# Altium schematic symbol library jlcpcb_2025_04_inductors_extended_0402.schlib: 1396 symbols (part 4 of 8) (continued)
## LQW15AN16NJ00D (continued)

## LQW15AN18NG00D
designator L?  Inductance: 18nH
Inductor, 18nH, ±2%, 270mΩ, 370mA, SMD 0402; Manufacturer: Murata Electronics; Manufacturer Part Number: LQW15AN18NG00D; Self-Resonant Frequency: 4.5GHz; Q Factor: 25@250MHz; Package Size: 0402; JLCPCB Basic Part: No; JLCPCB Part Number: C91622; Supplier 1: LCSC; Category: Inductors; Supplier Part Number 1: C91622; Tolerance: ±2%; Rated Current: 370mA; DC Resistance: 270mΩ; RoHS: Yes; ComponentLink1Description: Datasheet; ComponentLink1URL: https://wmsc.lcsc.com/wmsc/upload/file/pdf/v2/lcsc/1811081522_Murata-Electronics-LQW15AN18NG00D_C91622.pdf; ComponentLink2Description: JLCPCB Part URL; ComponentLink2URL: https://jlcpcb.com/partdetail/C91622; ComponentLink3Description: LCSC Part URL; ComponentLink3URL: https://lcsc.com/product-detail/Inductors-SMD_Murata-Electronics-Murata-Electronics-LQW15AN18NG00D_C91622.html
footprint IND-0402 (0402 (1005M) Inductor)
pins: 1, 2

## LQW15AN18NG80D
designator L?  Inductance: 18nH
Inductor, 18nH, ±2%, 130mΩ, 1.05A, SMD 0402; Manufacturer: Murata Electronics; Manufacturer Part Number: LQW15AN18NG80D; Package Size: 0402; JLCPCB Basic Part: No; JLCPCB Part Number: C908004; Supplier 1: LCSC; Category: Inductors; Supplier Part Number 1: C908004; Tolerance: ±2%; Rated Current: 1.05A; DC Resistance: 130mΩ; RoHS: Yes; ComponentLink1Description: Datasheet; ComponentLink1URL: https://wmsc.lcsc.com/wmsc/upload/file/pdf/v2/lcsc/2304140030_Murata-Electronics-LQW15AN18NG80D_C908004.pdf; ComponentLink2Description: JLCPCB Part URL; ComponentLink2URL: https://jlcpcb.com/partdetail/C908004; ComponentLink3Description: LCSC Part URL; ComponentLink3URL: https://lcsc.com/product-detail/Power-Inductors_Murata-Electronics-Murata-Electronics-LQW15AN18NG80D_C908004.html
footprint IND-0402 (0402 (1005M) Inductor)
pins: 1, 2

## LQW15AN18NH00D
designator L?  Inductance: 18nH
Inductor, 18nH, ±3%, 270mΩ, 370mA, SMD 0402; Manufacturer: Murata Electronics; Manufacturer Part Number: LQW15AN18NH00D; Self-Resonant Frequency: 4.5GHz; Q Factor: 25@250MHz; Package Size: 0402; JLCPCB Basic Part: No; JLCPCB Part Number: C237611; Supplier 1: LCSC; Category: Inductors; Supplier Part Number 1: C237611; Tolerance: ±3%; Rated Current: 370mA; DC Resistance: 270mΩ; RoHS: Yes; ComponentLink1Description: Datasheet; ComponentLink1URL: https://wmsc.lcsc.com/wmsc/upload/file/pdf/v2/lcsc/2304140030_Murata-Electronics-LQW15AN18NH00D_C237611.pdf; ComponentLink2Description: JLCPCB Part URL; ComponentLink2URL: https://jlcpcb.com/partdetail/C237611; ComponentLink3Description: LCSC Part URL; ComponentLink3URL: https://lcsc.com/product-detail/Inductors-SMD_Murata-Electronics-Murata-Electronics-LQW15AN18NH00D_C237611.html
footprint IND-0402 (0402 (1005M) Inductor)
pins: 1, 2

## LQW15AN18NJ00D
designator L?  Inductance: 18nH
Inductor, 18nH, ±5%, 270mΩ, SMD 0402; Manufacturer: Murata Electronics; Manufacturer Part Number: LQW15AN18NJ00D; Self-Resonant Frequency: 4.5GHz; Q Factor: 25@250MHz; Package Size: 0402; JLCPCB Basic Part: No; JLCPCB Part Number: C82917; Supplier 1: LCSC; Category: Inductors; Supplier Part Number 1: C82917; Tolerance: ±5%; DC Resistance: 270mΩ; RoHS: Yes; ComponentLink1Description: Datasheet; ComponentLink1URL: https://wmsc.lcsc.com/wmsc/upload/file/pdf/v2/lcsc/1811081614_Murata-Electronics-LQW15AN18NJ00D_C82917.pdf; ComponentLink2Description: JLCPCB Part URL; ComponentLink2URL: https://jlcpcb.com/partdetail/C82917; ComponentLink3Description: LCSC Part URL; ComponentLink3URL: https://lcsc.com/product-detail/Inductors-SMD_Murata-Electronics-Murata-Electronics-LQW15AN18NJ00D_C82917.html
footprint IND-0402 (0402 (1005M) Inductor)
pins: 1, 2

## LQW15AN18NJ80D
designator L?  Inductance: 18nH
Inductor, 18nH, ±5%, 130mΩ, SMD 0402; Manufacturer: Murata Electronics; Manufacturer Part Number: LQW15AN18NJ80D; Self-Resonant Frequency: 5.2GHz; Q Factor: 30@250MHz; Package Size: 0402; JLCPCB Basic Part: No; JLCPCB Part Number: C344018; Supplier 1: LCSC; Category: Inductors; Supplier Part Number 1: C344018; Tolerance: ±5%; DC Resistance: 130mΩ; RoHS: Yes; ComponentLink1Description: Datasheet; ComponentLink1URL: https://wmsc.lcsc.com/wmsc/upload/file/pdf/v2/lcsc/2304140030_Murata-Electronics-LQW15AN18NJ80D_C344018.pdf; ComponentLink2Description: JLCPCB Part URL; ComponentLink2URL: https://jlcpcb.com/partdetail/C344018; ComponentLink3Description: LCSC Part URL; ComponentLink3URL: https://lcsc.com/product-detail/Inductors-SMD_Murata-Electronics-Murata-Electronics-LQW15AN18NJ80D_C344018.html
footprint IND-0402 (0402 (1005M) Inductor)
pins: 1, 2

## LQW15AN19NG00D
designator L?  Inductance: 19nH
Inductor, 19nH, ±2%, 270mΩ, 370mA, SMD 0402; Manufacturer: Murata Electronics; Manufacturer Part Number: LQW15AN19NG00D; Self-Resonant Frequency: 4.5GHz; Q Factor: 25@250MHz; Package Size: 0402; JLCPCB Basic Part: No; JLCPCB Part Number: C115489; Supplier 1: LCSC; Category: Inductors; Supplier Part Number 1: C115489; Tolerance: ±2%; Rated Current: 370mA; DC Resistance: 270mΩ; RoHS: Yes; ComponentLink1Description: Datasheet; ComponentLink1URL: https://wmsc.lcsc.com/wmsc/upload/file/pdf/v2/lcsc/2304140030_Murata-Electronics-LQW15AN19NG00D_C115489.pdf; ComponentLink2Description: JLCPCB Part URL; ComponentLink2URL: https://jlcpcb.com/partdetail/C115489; ComponentLink3Description: LCSC Part URL; ComponentLink3URL: https://lcsc.com/product-detail/Inductors-SMD_Murata-Electronics-Murata-Electronics-LQW15AN19NG00D_C115489.html
footprint IND-0402 (0402 (1005M) Inductor)
pins: 1, 2

## LQW15AN19NJ00D
designator L?  Inductance: 19nH
Inductor, 19nH, ±5%, 270mΩ, 370mA, SMD 0402; Manufacturer: Murata Electronics; Manufacturer Part Number: LQW15AN19NJ00D; Package Size: 0402; JLCPCB Basic Part: No; JLCPCB Part Number: C341685; Supplier 1: LCSC; Category: Inductors; Supplier Part Number 1: C341685; Tolerance: ±5%; Rated Current: 370mA; DC Resistance: 270mΩ; RoHS: Yes; ComponentLink1Description: Datasheet; ComponentLink1URL: https://wmsc.lcsc.com/wmsc/upload/file/pdf/v2/lcsc/2308111554_Murata-Electronics-LQW15AN19NJ00D_C341685.pdf; ComponentLink2Description: JLCPCB Part URL; ComponentLink2URL: https://jlcpcb.com/partdetail/C341685; ComponentLink3Description: LCSC Part URL; ComponentLink3URL: https://lcsc.com/product-detail/Power-Inductors_Murata-Electronics-Murata-Electronics-LQW15AN19NJ00D_C341685.html
footprint IND-0402 (0402 (1005M) Inductor)
pins: 1, 2

## LQW15AN20NG00D
designator L?  Inductance: 20nH
Inductor, 20nH, ±2%, 270mΩ, 370mA, SMD 0402; Manufacturer: Murata Electronics; Manufacturer Part Number: LQW15AN20NG00D; Self-Resonant Frequency: 4GHz; Q Factor: 25@250MHz; Package Size: 0402; JLCPCB Basic Part: No; JLCPCB Part Number: C167469; Supplier 1: LCSC; Category: Inductors; Supplier Part Number 1: C167469; Tolerance: ±2%; Rated Current: 370mA; DC Resistance: 270mΩ; RoHS: Yes; ComponentLink1Description: Datasheet; ComponentLink1URL: https://wmsc.lcsc.com/wmsc/upload/file/pdf/v2/lcsc/2304140030_Murata-Electronics-LQW15AN20NG00D_C167469.pdf; ComponentLink2Description: JLCPCB Part URL; ComponentLink2URL: https://jlcpcb.com/partdetail/C167469; ComponentLink3Description: LCSC Part URL; ComponentLink3URL: https://lcsc.com/product-detail/Inductors-SMD_Murata-Electronics-Murata-Electronics-LQW15AN20NG00D_C167469.html
footprint IND-0402 (0402 (1005M) Inductor)
pins: 1, 2

## LQW15AN20NJ00D
designator L?  Inductance: 20nH
Inductor, 20nH, ±5%, 270mΩ, 370mA, SMD 0402; Manufacturer: Murata Electronics; Manufacturer Part Number: LQW15AN20NJ00D; Package Size: 0402; JLCPCB Basic Part: No; JLCPCB Part Number: C668461; Supplier 1: LCSC; Category: Inductors; Supplier Part Number 1: C668461; Tolerance: ±5%; Rated Current: 370mA; DC Resistance: 270mΩ; RoHS: Yes; ComponentLink1Description: Datasheet; ComponentLink1URL: https://wmsc.lcsc.com/wmsc/upload/file/pdf/v2/lcsc/2304140030_Murata-Electronics-LQW15AN20NJ00D_C668461.pdf; ComponentLink2Description: JLCPCB Part URL; ComponentLink2URL: https://jlcpcb.com/partdetail/C668461; ComponentLink3Description: LCSC Part URL; ComponentLink3URL: https://lcsc.com/product-detail/Power-Inductors_Murata-Electronics-Murata-Electronics-LQW15AN20NJ00D_C668461.html
footprint IND-0402 (0402 (1005M) Inductor)
pins: 1, 2

## LQW15AN22NG00D
designator L?  Inductance: 22nH
Inductor, 22nH, ±2%, 300mΩ, 310mA, SMD 0402; Manufacturer: Murata Electronics; Manufacturer Part Number: LQW15AN22NG00D; Self-Resonant Frequency: 4GHz; Q Factor: 25@250MHz; Package Size: 0402; JLCPCB Basic Part: No; JLCPCB Part Number: C86129; Supplier 1: LCSC; Category: Inductors; Supplier Part Number 1: C86129; Tolerance: ±2%; Rated Current: 310mA; DC Resistance: 300mΩ; RoHS: Yes; ComponentLink1Description: Datasheet; ComponentLink1URL: https://wmsc.lcsc.com/wmsc/upload/file/pdf/v2/lcsc/1811081610_Murata-Electronics-LQW15AN22NG00D_C86129.pdf; ComponentLink2Description: JLCPCB Part URL; ComponentLink2URL: https://jlcpcb.com/partdetail/C86129; ComponentLink3Description: LCSC Part URL; ComponentLink3URL: https://lcsc.com/product-detail/Inductors-SMD_Murata-Electronics-Murata-Electronics-LQW15AN22NG00D_C86129.html
footprint IND-0402 (0402 (1005M) Inductor)
pins: 1, 2

## LQW15AN22NG80D
designator L?  Inductance: 22nH
Inductor, 22nH, ±2%, 202mΩ, 780mA, SMD 0402; Manufacturer: Murata Electronics; Manufacturer Part Number: LQW15AN22NG80D; Package Size: 0402; JLCPCB Basic Part: No; JLCPCB Part Number: C524641; Supplier 1: LCSC; Category: Inductors; Supplier Part Number 1: C524641; Tolerance: ±2%; Rated Current: 780mA; DC Resistance: 202mΩ; RoHS: Yes; ComponentLink1Description: Datasheet; ComponentLink1URL: https://wmsc.lcsc.com/wmsc/upload/file/pdf/v2/lcsc/2304140030_Murata-Electronics-LQW15AN22NG80D_C524641.pdf; ComponentLink2Description: JLCPCB Part URL; ComponentLink2URL: https://jlcpcb.com/partdetail/C524641; ComponentLink3Description: LCSC Part URL; ComponentLink3URL: https://lcsc.com/product-detail/Power-Inductors_Murata-Electronics-Murata-Electronics-LQW15AN22NG80D_C524641.html
footprint IND-0402 (0402 (1005M) Inductor)
pins: 1, 2

## LQW15AN22NH00D
designator L?  Inductance: 22nH
Inductor, 22nH, ±3%, 300mΩ, 310mA, SMD 0402; Manufacturer: Murata Electronics; Manufacturer Part Number: LQW15AN22NH00D; Self-Resonant Frequency: 4GHz; Q Factor: 25@250MHz; Package Size: 0402; JLCPCB Basic Part: No; JLCPCB Part Number: C703122; Supplier 1: LCSC; Category: Inductors; Supplier Part Number 1: C703122; Tolerance: ±3%; Rated Current: 310mA; DC Resistance: 300mΩ; RoHS: Yes; ComponentLink1Description: Datasheet; ComponentLink1URL: https://wmsc.lcsc.com/wmsc/upload/file/pdf/v2/lcsc/2304140030_Murata-Electronics-LQW15AN22NH00D_C703122.pdf; ComponentLink2Description: JLCPCB Part URL; ComponentLink2URL: https://jlcpcb.com/partdetail/C703122; ComponentLink3Description: LCSC Part URL; ComponentLink3URL: https://lcsc.com/product-detail/Inductors-SMD_Murata-Electronics-Murata-Electronics-LQW15AN22NH00D_C703122.html
footprint IND-0402 (0402 (1005M) Inductor)
pins: 1, 2

## LQW15AN22NJ00D
designator L?  Inductance: 22nH
Inductor, 22nH, ±5%, 300mΩ, 310mA, SMD 0402; Manufacturer: Murata Electronics; Manufacturer Part Number: LQW15AN22NJ00D; Self-Resonant Frequency: 4GHz; Q Factor: 25@250MHz; Package Size: 0402; JLCPCB Basic Part: No; JLCPCB Part Number: C167470; Supplier 1: LCSC; Category: Inductors; Supplier Part Number 1: C167470; Tolerance: ±5%; Rated Current: 310mA; DC Resistance: 300mΩ; RoHS: Yes; ComponentLink1Description: Datasheet; ComponentLink1URL: https://wmsc.lcsc.com/wmsc/upload/file/pdf/v2/lcsc/2304140030_Murata-Electronics-LQW15AN22NJ00D_C167470.pdf; ComponentLink2Description: JLCPCB Part URL; ComponentLink2URL: https://jlcpcb.com/partdetail/C167470; ComponentLink3Description: LCSC Part URL; ComponentLink3URL: https://lcsc.com/product-detail/Inductors-SMD_Murata-Electronics-Murata-Electronics-LQW15AN22NJ00D_C167470.html
footprint IND-0402 (0402 (1005M) Inductor)
pins: 1, 2

## LQW15AN22NJ80D
designator L?  Inductance: 22nH
Inductor, 22nH, ±5%, 202mΩ, 780mA, SMD 0402; Manufacturer: Murata Electronics; Manufacturer Part Number: LQW15AN22NJ80D; Package Size: 0402; JLCPCB Basic Part: No; JLCPCB Part Number: C2044048; Supplier 1: LCSC; Category: Inductors; Supplier Part Number 1: C2044048; Tolerance: ±5%; Rated Current: 780mA; DC Resistance: 202mΩ; RoHS: Yes; ComponentLink1Description: Datasheet; ComponentLink1URL: https://wmsc.lcsc.com/wmsc/upload/file/pdf/v2/lcsc/2304140030_Murata-Electronics-LQW15AN22NJ80D_C2044048.pdf; ComponentLink2Description: JLCPCB Part URL; ComponentLink2URL: https://jlcpcb.com/partdetail/C2044048; ComponentLink3Description: LCSC Part URL; ComponentLink3URL: https://lcsc.com/product-detail/Power-Inductors_Murata-Electronics-Murata-Electronics-LQW15AN22NJ80D_C2044048.html
footprint IND-0402 (0402 (1005M) Inductor)
pins: 1, 2

## LQW15AN23NG00D
designator L?  Inductance: 23nH
Inductor, 23nH, ±2%, 300mΩ, SMD 0402; Manufacturer: Murata Electronics; Manufacturer Part Number: LQW15AN23NG00D; Self-Resonant Frequency: 3.8GHz; Q Factor: 25@250MHz; Package Size: 0402; JLCPCB Basic Part: No; JLCPCB Part Number: C167471; Supplier 1: LCSC; Category: Inductors; Supplier Part Number 1: C167471; Tolerance: ±2%; DC Resistance: 300mΩ; RoHS: Yes; ComponentLink1Description: Datasheet; ComponentLink1URL: https://wmsc.lcsc.com/wmsc/upload/file/pdf/v2/lcsc/2304140030_Murata-Electronics-LQW15AN23NG00D_C167471.pdf; ComponentLink2Description: JLCPCB Part URL; ComponentLink2URL: https://jlcpcb.com/partdetail/C167471; ComponentLink3Description: LCSC Part URL; ComponentLink3URL: https://lcsc.com/product-detail/Inductors-SMD_Murata-Electronics-Murata-Electronics-LQW15AN23NG00D_C167471.html
footprint IND-0402 (0402 (1005M) Inductor)
pins: 1, 2

## LQW15AN24NG00D
designator L?  Inductance: 24nH
Inductor, 24nH, ±2%, 520mΩ, 280mA, SMD 0402; Manufacturer: Murata Electronics; Manufacturer Part Number: LQW15AN24NG00D; Self-Resonant Frequency: 3.5GHz; Q Factor: 25@250MHz; Package Size: 0402; JLCPCB Basic Part: No; JLCPCB Part Number: C167472; Supplier 1: LCSC; Category: Inductors; Supplier Part Number 1: C167472; Tolerance: ±2%; Rated Current: 280mA; DC Resistance: 520mΩ; RoHS: Yes; ComponentLink1Description: Datasheet; ComponentLink1URL: https://wmsc.lcsc.com/wmsc/upload/file/pdf/v2/lcsc/2304140030_Murata-Electronics-LQW15AN24NG00D_C167472.pdf; ComponentLink2Description: JLCPCB Part URL; ComponentLink2URL: https://jlcpcb.com/partdetail/C167472; ComponentLink3Description: LCSC Part URL; ComponentLink3URL: https://lcsc.com/product-detail/Inductors-SMD_Murata-Electronics-Murata-Electronics-LQW15AN24NG00D_C167472.html
footprint IND-0402 (0402 (1005M) Inductor)
pins: 1, 2

## LQW15AN24NG80D
designator L?  Inductance: 24nH
Inductor, 24nH, ±2%, 212mΩ, 770mA, SMD 0402; Manufacturer: Murata Electronics; Manufacturer Part Number: LQW15AN24NG80D; Package Size: 0402; JLCPCB Basic Part: No; JLCPCB Part Number: C668462; Supplier 1: LCSC; Category: Inductors; Supplier Part Number 1: C668462; Tolerance: ±2%; Rated Current: 770mA; DC Resistance: 212mΩ; RoHS: Yes; ComponentLink1Description: Datasheet; ComponentLink1URL: https://wmsc.lcsc.com/wmsc/upload/file/pdf/v2/lcsc/2105241313_Murata-Electronics-LQW15AN24NG80D_C668462.pdf; ComponentLink2Description: JLCPCB Part URL; ComponentLink2URL: https://jlcpcb.com/partdetail/C668462; ComponentLink3Description: LCSC Part URL; ComponentLink3URL: https://lcsc.com/product-detail/Power-Inductors_Murata-Electronics-Murata-Electronics-LQW15AN24NG80D_C668462.html
footprint IND-0402 (0402 (1005M) Inductor)
pins: 1, 2

## LQW15AN24NJ00D
designator L?  Inductance: 24nH
Inductor, 24nH, ±5%, 520mΩ, 280mA, SMD 0402; Manufacturer: Murata Electronics; Manufacturer Part Number: LQW15AN24NJ00D; Self-Resonant Frequency: 3.5GHz; Q Factor: 25@250MHz; Package Size: 0402; JLCPCB Basic Part: No; JLCPCB Part Number: C341784; Supplier 1: LCSC; Category: Inductors; Supplier Part Number 1: C341784; Tolerance: ±5%; Rated Current: 280mA; DC Resistance: 520mΩ; RoHS: Yes; ComponentLink1Description: Datasheet; ComponentLink1URL: https://wmsc.lcsc.com/wmsc/upload/file/pdf/v2/lcsc/2304140030_Murata-Electronics-LQW15AN24NJ00D_C341784.pdf; ComponentLink2Description: JLCPCB Part URL; ComponentLink2URL: https://jlcpcb.com/partdetail/C341784; ComponentLink3Description: LCSC Part URL; ComponentLink3URL: https://lcsc.com/product-detail/Inductors-SMD_Murata-Electronics-Murata-Electronics-LQW15AN24NJ00D_C341784.html
footprint IND-0402 (0402 (1005M) Inductor)
pins: 1, 2

## LQW15AN27NG00D
designator L?  Inductance: 27nH
Inductor, 27nH, ±2%, 520mΩ, 280mA, SMD 0402; Manufacturer: Murata Electronics; Manufacturer Part Number: LQW15AN27NG00D; Self-Resonant Frequency: 3.5GHz; Q Factor: 25@250MHz; Package Size: 0402; JLCPCB Basic Part: No; JLCPCB Part Number: C98057; Supplier 1: LCSC; Category: Inductors; Supplier Part Number 1: C98057; Tolerance: ±2%; Rated Current: 280mA; DC Resistance: 520mΩ; RoHS: Yes; ComponentLink1Description: Datasheet; ComponentLink1URL: https://wmsc.lcsc.com/wmsc/upload/file/pdf/v2/lcsc/2304140030_Murata-Electronics-LQW15AN27NG00D_C98057.pdf; ComponentLink2Description: JLCPCB Part URL; ComponentLink2URL: https://jlcpcb.com/partdetail/C98057; ComponentLink3Description: LCSC Part URL; ComponentLink3URL: https://lcsc.com/product-detail/Inductors-SMD_Murata-Electronics-Murata-Electronics-LQW15AN27NG00D_C98057.html
footprint IND-0402 (0402 (1005M) Inductor)
pins: 1, 2

## LQW15AN27NG8ZD
designator L?  Inductance: 27nH
Inductor, 27nH, ±2%, 288mΩ, 680mA, SMD 0402; Manufacturer: Murata Electronics; Manufacturer Part Number: LQW15AN27NG8ZD; Package Size: 0402; JLCPCB Basic Part: No; JLCPCB Part Number: C2041663; Supplier 1: LCSC; Category: Inductors; Supplier Part Number 1: C2041663; Tolerance: ±2%; Rated Current: 680mA; DC Resistance: 288mΩ; RoHS: Yes; ComponentLink1Description: Datasheet; ComponentLink1URL: https://wmsc.lcsc.com/wmsc/upload/file/pdf/v2/lcsc/2304140030_Murata-Electronics-LQW15AN27NG8ZD_C2041663.pdf; ComponentLink2Description: JLCPCB Part URL; ComponentLink2URL: https://jlcpcb.com/partdetail/C2041663; ComponentLink3Description: LCSC Part URL; ComponentLink3URL: https://lcsc.com/product-detail/Power-Inductors_Murata-Electronics-Murata-Electronics-LQW15AN27NG8ZD_C2041663.html
footprint IND-0402 (0402 (1005M) Inductor)
pins: 1, 2

## LQW15AN27NG80D
designator L?  Inductance: 27nH
Inductor, 27nH, ±2%, 288mΩ, SMD 0402; Manufacturer: Murata Electronics; Manufacturer Part Number: LQW15AN27NG80D; Self-Resonant Frequency: 4GHz; Q Factor: 30@250MHz; Package Size: 0402; JLCPCB Basic Part: No; JLCPCB Part Number: C882469; Supplier 1: LCSC; Category: Inductors; Supplier Part Number 1: C882469; Tolerance: ±2%; DC Resistance: 288mΩ; RoHS: Yes; ComponentLink1Description: Datasheet; ComponentLink1URL: https://wmsc.lcsc.com/wmsc/upload/file/pdf/v2/lcsc/2201242130_Murata-Electronics-LQW15AN27NG80D_C882469.pdf; ComponentLink2Description: JLCPCB Part URL; ComponentLink2URL: https://jlcpcb.com/partdetail/C882469; ComponentLink3Description: LCSC Part URL; ComponentLink3URL: https://lcsc.com/product-detail/Inductors-SMD_Murata-Electronics-Murata-Electronics-LQW15AN27NG80D_C882469.html
footprint IND-0402 (0402 (1005M) Inductor)
pins: 1, 2

## LQW15AN27NH00D
designator L?  Inductance: 27nH
Inductor, 27nH, ±3%, 520mΩ, 280mA, SMD 0402; Manufacturer: Murata Electronics; Manufacturer Part Number: LQW15AN27NH00D; Self-Resonant Frequency: 3.5GHz; Q Factor: 25@250MHz; Package Size: 0402; JLCPCB Basic Part: No; JLCPCB Part Number: C113111; Supplier 1: LCSC; Category: Inductors; Supplier Part Number 1: C113111; Tolerance: ±3%; Rated Current: 280mA; DC Resistance: 520mΩ; RoHS: Yes; ComponentLink1Description: Datasheet; ComponentLink1URL: https://wmsc.lcsc.com/wmsc/upload/file/pdf/v2/lcsc/2304140030_Murata-Electronics-LQW15AN27NH00D_C113111.pdf; ComponentLink2Description: JLCPCB Part URL; ComponentLink2URL: https://jlcpcb.com/partdetail/C113111; ComponentLink3Description: LCSC Part URL; ComponentLink3URL: https://lcsc.com/product-detail/Inductors-SMD_Murata-Electronics-Murata-Electronics-LQW15AN27NH00D_C113111.html
footprint IND-0402 (0402 (1005M) Inductor)
pins: 1, 2

## LQW15AN27NJ00D
designator L?  Inductance: 27nH
Inductor, 27nH, ±5%, 520mΩ, 280mA, SMD 0402; Manufacturer: Murata Electronics; Manufacturer Part Number: LQW15AN27NJ00D; Self-Resonant Frequency: 3.5GHz; Q Factor: 25@250MHz; Package Size: 0402; JLCPCB Basic Part: No; JLCPCB Part Number: C113112; Supplier 1: LCSC; Category: Inductors; Supplier Part Number 1: C113112; Tolerance: ±5%; Rated Current: 280mA; DC Resistance: 520mΩ; RoHS: Yes; ComponentLink1Description: Datasheet; ComponentLink1URL: https://wmsc.lcsc.com/wmsc/upload/file/pdf/v2/lcsc/2304140030_Murata-Electronics-LQW15AN27NJ00D_C113112.pdf; ComponentLink2Description: JLCPCB Part URL; ComponentLink2URL: https://jlcpcb.com/partdetail/C113112; ComponentLink3Description: LCSC Part URL; ComponentLink3URL: https://lcsc.com/product-detail/Inductors-SMD_Murata-Electronics-Murata-Electronics-LQW15AN27NJ00D_C113112.html
footprint IND-0402 (0402 (1005M) Inductor)
pins: 1, 2

## LQW15AN30NG00D
designator L?  Inductance: 30nH
Inductor, 30nH, ±2%, 580mΩ, SMD 0402; Manufacturer: Murata Electronics; Manufacturer Part Number: LQW15AN30NG00D; Self-Resonant Frequency: 3.3GHz; Q Factor: 25@250MHz; Package Size: 0402; JLCPCB Basic Part: No; JLCPCB Part Number: C91623; Supplier 1: LCSC; Category: Inductors; Supplier Part Number 1: C91623; Tolerance: ±2%; DC Resistance: 580mΩ; RoHS: Yes; ComponentLink1Description: Datasheet; ComponentLink1URL: https://wmsc.lcsc.com/wmsc/upload/file/pdf/v2/lcsc/1811081613_Murata-Electronics-LQW15AN30NG00D_C91623.pdf; ComponentLink2Description: JLCPCB Part URL; ComponentLink2URL: https://jlcpcb.com/partdetail/C91623; ComponentLink3Description: LCSC Part URL; ComponentLink3URL: https://lcsc.com/product-detail/Inductors-SMD_Murata-Electronics-Murata-Electronics-LQW15AN30NG00D_C91623.html
footprint IND-0402 (0402 (1005M) Inductor)
pins: 1, 2

## LQW15AN30NH00D
designator L?  Inductance: 30nH
Inductor, 30nH, ±3%, 580mΩ, 270mA, SMD 0402; Manufacturer: Murata Electronics; Manufacturer Part Number: LQW15AN30NH00D; Self-Resonant Frequency: 3.3GHz; Q Factor: 25@250MHz; Package Size: 0402; JLCPCB Basic Part: No; JLCPCB Part Number: C341687; Supplier 1: LCSC; Category: Inductors; Supplier Part Number 1: C341687; Tolerance: ±3%; Rated Current: 270mA; DC Resistance: 580mΩ; RoHS: Yes; ComponentLink1Description: Datasheet; ComponentLink1URL: https://wmsc.lcsc.com/wmsc/upload/file/pdf/v2/lcsc/2304140030_Murata-Electronics-LQW15AN30NH00D_C341687.pdf; ComponentLink2Description: JLCPCB Part URL; ComponentLink2URL: https://jlcpcb.com/partdetail/C341687; ComponentLink3Description: LCSC Part URL; ComponentLink3URL: https://lcsc.com/product-detail/Inductors-SMD_Murata-Electronics-Murata-Electronics-LQW15AN30NH00D_C341687.html
footprint IND-0402 (0402 (1005M) Inductor)
pins: 1, 2

## LQW15AN30NJ00D
designator L?  Inductance: 30nH
Inductor, 30nH, ±5%, 580mΩ, 270mA, SMD 0402; Manufacturer: Murata Electronics; Manufacturer Part Number: LQW15AN30NJ00D; Package Size: 0402; JLCPCB Basic Part: No; JLCPCB Part Number: C437362; Supplier 1: LCSC; Category: Inductors; Supplier Part Number 1: C437362; Tolerance: ±5%; Rated Current: 270mA; DC Resistance: 580mΩ; RoHS: Yes; ComponentLink1Description: Datasheet; ComponentLink1URL: https://wmsc.lcsc.com/wmsc/upload/file/pdf/v2/lcsc/2304140030_Murata-Electronics-LQW15AN30NJ00D_C437362.pdf; ComponentLink2Description: JLCPCB Part URL; ComponentLink2URL: https://jlcpcb.com/partdetail/C437362; ComponentLink3Description: LCSC Part URL; ComponentLink3URL: https://lcsc.com/product-detail/Power-Inductors_Murata-Electronics-Murata-Electronics-LQW15AN30NJ00D_C437362.html
footprint IND-0402 (0402 (1005M) Inductor)
pins: 1, 2

## LQW15AN33NG00D
designator L?  Inductance: 33nH
Inductor, 33nH, ±2%, 630mΩ, 260mA, SMD 0402; Manufacturer: Murata Electronics; Manufacturer Part Number: LQW15AN33NG00D; Self-Resonant Frequency: 3.2GHz; Q Factor: 25@250MHz; Package Size: 0402; JLCPCB Basic Part: No; JLCPCB Part Number: C113114; Supplier 1: LCSC; Category: Inductors; Supplier Part Number 1: C113114; Tolerance: ±2%; Rated Current: 260mA; DC Resistance: 630mΩ; RoHS: Yes; ComponentLink1Description: Datasheet; ComponentLink1URL: https://wmsc.lcsc.com/wmsc/upload/file/pdf/v2/lcsc/2304140030_Murata-Electronics-LQW15AN33NG00D_C113114.pdf; ComponentLink2Description: JLCPCB Part URL; ComponentLink2URL: https://jlcpcb.com/partdetail/C113114; ComponentLink3Description: LCSC Part URL; ComponentLink3URL: https://lcsc.com/product-detail/Inductors-SMD_Murata-Electronics-Murata-Electronics-LQW15AN33NG00D_C113114.html
footprint IND-0402 (0402 (1005M) Inductor)
pins: 1, 2

## LQW15AN33NG80D
designator L?  Inductance: 33nH
Inductor, 33nH, ±2%, 336mΩ, 620mA, SMD 0402; Manufacturer: Murata Electronics; Manufacturer Part Number: LQW15AN33NG80D; Package Size: 0402; JLCPCB Basic Part: No; JLCPCB Part Number: C2043859; Supplier 1: LCSC; Category: Inductors; Supplier Part Number 1: C2043859; Tolerance: ±2%; Rated Current: 620mA; DC Resistance: 336mΩ; RoHS: Yes; ComponentLink1Description: Datasheet; ComponentLink1URL: https://wmsc.lcsc.com/wmsc/upload/file/pdf/v2/lcsc/2304140030_Murata-Electronics-LQW15AN33NG80D_C2043859.pdf; ComponentLink2Description: JLCPCB Part URL; ComponentLink2URL: https://jlcpcb.com/partdetail/C2043859; ComponentLink3Description: LCSC Part URL; ComponentLink3URL: https://lcsc.com/product-detail/Power-Inductors_Murata-Electronics-Murata-Electronics-LQW15AN33NG80D_C2043859.html
footprint IND-0402 (0402 (1005M) Inductor)
pins: 1, 2

## LQW15AN33NH00D
designator L?  Inductance: 33nH
Inductor, 33nH, ±3%, 630mΩ, SMD 0402; Manufacturer: Murata Electronics; Manufacturer Part Number: LQW15AN33NH00D; Self-Resonant Frequency: 3.2GHz; Q Factor: 25@250MHz; Package Size: 0402; JLCPCB Basic Part: No; JLCPCB Part Number: C307609; Supplier 1: LCSC; Category: Inductors; Supplier Part Number 1: C307609; Tolerance: ±3%; DC Resistance: 630mΩ; RoHS: Yes; ComponentLink1Description: Datasheet; ComponentLink1URL: https://wmsc.lcsc.com/wmsc/upload/file/pdf/v2/lcsc/2304140030_Murata-Electronics-LQW15AN33NH00D_C307609.pdf; ComponentLink2Description: JLCPCB Part URL; ComponentLink2URL: https://jlcpcb.com/partdetail/C307609; ComponentLink3Description: LCSC Part URL; ComponentLink3URL: https://lcsc.com/product-detail/Inductors-SMD_Murata-Electronics-Murata-Electronics-LQW15AN33NH00D_C307609.html
footprint IND-0402 (0402 (1005M) Inductor)
pins: 1, 2

## LQW15AN33NJ00D
designator L?  Inductance: 33nH
Inductor, 33nH, ±5%, 630mΩ, SMD 0402; Manufacturer: Murata Electronics; Manufacturer Part Number: LQW15AN33NJ00D; Self-Resonant Frequency: 3.2GHz; Q Factor: 25@250MHz; Package Size: 0402; JLCPCB Basic Part: No; JLCPCB Part Number: C192564; Supplier 1: LCSC; Category: Inductors; Supplier Part Number 1: C192564; Tolerance: ±5%; DC Resistance: 630mΩ; RoHS: Yes; ComponentLink1Description: Datasheet; ComponentLink1URL: https://wmsc.lcsc.com/wmsc/upload/file/pdf/v2/lcsc/2304140030_Murata-Electronics-LQW15AN33NJ00D_C192564.pdf; ComponentLink2Description: JLCPCB Part URL; ComponentLink2URL: https://jlcpcb.com/partdetail/C192564; ComponentLink3Description: LCSC Part URL; ComponentLink3URL: https://lcsc.com/product-detail/Inductors-SMD_Murata-Electronics-Murata-Electronics-LQW15AN33NJ00D_C192564.html
footprint IND-0402 (0402 (1005M) Inductor)
pins: 1, 2

## LQW15AN36NG00D
designator L?  Inductance: 36nH
Inductor, 36nH, ±2%, 630mΩ, 260mA, SMD 0402; Manufacturer: Murata Electronics; Manufacturer Part Number: LQW15AN36NG00D; Self-Resonant Frequency: 3.1GHz; Q Factor: 25@250MHz; Package Size: 0402; JLCPCB Basic Part: No; JLCPCB Part Number: C167476; Supplier 1: LCSC; Category: Inductors; Supplier Part Number 1: C167476; Tolerance: ±2%; Rated Current: 260mA; DC Resistance: 630mΩ; RoHS: Yes; ComponentLink1Description: Datasheet; ComponentLink1URL: https://wmsc.lcsc.com/wmsc/upload/file/pdf/v2/lcsc/2304140030_Murata-Electronics-LQW15AN36NG00D_C167476.pdf; ComponentLink2Description: JLCPCB Part URL; ComponentLink2URL: https://jlcpcb.com/partdetail/C167476; ComponentLink3Description: LCSC Part URL; ComponentLink3URL: https://lcsc.com/product-detail/Inductors-SMD_Murata-Electronics-Murata-Electronics-LQW15AN36NG00D_C167476.html
footprint IND-0402 (0402 (1005M) Inductor)
pins: 1, 2

## LQW15AN39NG00D
designator L?  Inductance: 39nH
Inductor, 39nH, ±2%, 700mΩ, 250mA, SMD 0402; Manufacturer: Murata Electronics; Manufacturer Part Number: LQW15AN39NG00D; Self-Resonant Frequency: 3GHz; Q Factor: 25@250MHz; Package Size: 0402; JLCPCB Basic Part: No; JLCPCB Part Number: C98059; Supplier 1: LCSC; Category: Inductors; Supplier Part Number 1: C98059; Tolerance: ±2%; Rated Current: 250mA; DC Resistance: 700mΩ; RoHS: Yes; ComponentLink1Description: Datasheet; ComponentLink1URL: https://wmsc.lcsc.com/wmsc/upload/file/pdf/v2/lcsc/2304140030_Murata-Electronics-LQW15AN39NG00D_C98059.pdf; ComponentLink2Description: JLCPCB Part URL; ComponentLink2URL: https://jlcpcb.com/partdetail/C98059; ComponentLink3Description: LCSC Part URL; ComponentLink3URL: https://lcsc.com/product-detail/Inductors-SMD_Murata-Electronics-Murata-Electronics-LQW15AN39NG00D_C98059.html
footprint IND-0402 (0402 (1005M) Inductor)
pins: 1, 2

## LQW15AN39NG80D
designator L?  Inductance: 39nH
Inductor, 39nH, ±2%, 456mΩ, 530mA, SMD 0402; Manufacturer: Murata Electronics; Manufacturer Part Number: LQW15AN39NG80D; Self-Resonant Frequency: 3.4GHz; Q Factor: 28@250MHz; Package Size: 0402; JLCPCB Basic Part: No; JLCPCB Part Number: C269823; Supplier 1: LCSC; Category: Inductors; Supplier Part Number 1: C269823; Tolerance: ±2%; Rated Current: 530mA; DC Resistance: 456mΩ; RoHS: Yes; ComponentLink1Description: Datasheet; ComponentLink1URL: https://wmsc.lcsc.com/wmsc/upload/file/pdf/v2/lcsc/2304140030_Murata-Electronics-LQW15AN39NG80D_C269823.pdf; ComponentLink2Description: JLCPCB Part URL; ComponentLink2URL: https://jlcpcb.com/partdetail/C269823; ComponentLink3Description: LCSC Part URL; ComponentLink3URL: https://lcsc.com/product-detail/Inductors-SMD_Murata-Electronics-Murata-Electronics-LQW15AN39NG80D_C269823.html
footprint IND-0402 (0402 (1005M) Inductor)
pins: 1, 2

## LQW15AN39NJ00D
designator L?  Inductance: 39nH
Inductor, 39nH, ±5%, 700mΩ, 250mA, SMD 0402; Manufacturer: Murata Electronics; Manufacturer Part Number: LQW15AN39NJ00D; Self-Resonant Frequency: 3GHz; Q Factor: 25@250MHz; Package Size: 0402; JLCPCB Basic Part: No; JLCPCB Part Number: C98060; Supplier 1: LCSC; Category: Inductors; Supplier Part Number 1: C98060; Tolerance: ±5%; Rated Current: 250mA; DC Resistance: 700mΩ; RoHS: Yes; ComponentLink1Description: Datasheet; ComponentLink1URL: https://wmsc.lcsc.com/wmsc/upload/file/pdf/v2/lcsc/2304140030_Murata-Electronics-LQW15AN39NJ00D_C98060.pdf; ComponentLink2Description: JLCPCB Part URL; ComponentLink2URL: https://jlcpcb.com/partdetail/C98060; ComponentLink3Description: LCSC Part URL; ComponentLink3URL: https://lcsc.com/product-detail/Inductors-SMD_Murata-Electronics-Murata-Electronics-LQW15AN39NJ00D_C98060.html
footprint IND-0402 (0402 (1005M) Inductor)
pins: 1, 2

## LQW15AN39NJ0ZD
designator L?  Inductance: 39nH
Inductor, 39nH, ±5%, 700mΩ, 250mA, SMD 0402; Manufacturer: Murata Electronics; Manufacturer Part Number: LQW15AN39NJ0ZD; Package Size: 0402; JLCPCB Basic Part: No; JLCPCB Part Number: C408157; Supplier 1: LCSC; Category: Inductors; Supplier Part Number 1: C408157; Tolerance: ±5%; Rated Current: 250mA; DC Resistance: 700mΩ; RoHS: Yes; ComponentLink1Description: Datasheet; ComponentLink1URL: https://wmsc.lcsc.com/wmsc/upload/file/pdf/v2/lcsc/2304140030_Murata-Electronics-LQW15AN39NJ0ZD_C408157.pdf; ComponentLink2Description: JLCPCB Part URL; ComponentLink2URL: https://jlcpcb.com/partdetail/C408157; ComponentLink3Description: LCSC Part URL; ComponentLink3URL: https://lcsc.com/product-detail/Inductors-SMD_Murata-Electronics-Murata-Electronics-LQW15AN39NJ0ZD_C408157.html
footprint IND-0402 (0402 (1005M) Inductor)
pins: 1, 2

## LQW15AN40NG00D
designator L?  Inductance: 40nH
Inductor, 40nH, ±2%, 700mΩ, SMD 0402; Manufacturer: Murata Electronics; Manufacturer Part Number: LQW15AN40NG00D; Self-Resonant Frequency: 3GHz; Q Factor: 25@250MHz; Package Size: 0402; JLCPCB Basic Part: No; JLCPCB Part Number: C167477; Supplier 1: LCSC; Category: Inductors; Supplier Part Number 1: C167477; Tolerance: ±2%; DC Resistance: 700mΩ; RoHS: Yes; ComponentLink1Description: Datasheet; ComponentLink1URL: https://wmsc.lcsc.com/wmsc/upload/file/pdf/v2/lcsc/2304140030_Murata-Electronics-LQW15AN40NG00D_C167477.pdf; ComponentLink2Description: JLCPCB Part URL; ComponentLink2URL: https://jlcpcb.com/partdetail/C167477; ComponentLink3Description: LCSC Part URL; ComponentLink3URL: https://lcsc.com/product-detail/Inductors-SMD_Murata-Electronics-Murata-Electronics-LQW15AN40NG00D_C167477.html
footprint IND-0402 (0402 (1005M) Inductor)
pins: 1, 2

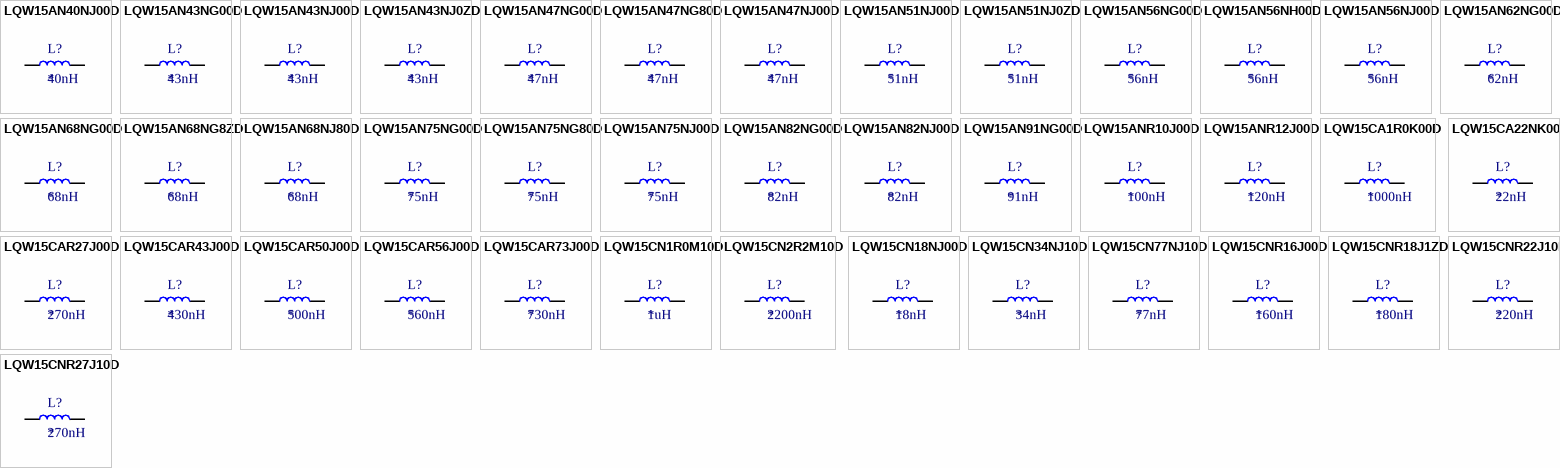
[diagram p16: symbols LQW15AN40NJ00D to LQW15CNR27J10D]

## LQW15AN40NJ00D
designator L?  Inductance: 40nH
Inductor, 40nH, ±5%, 700mΩ, 250mA, SMD 0402; Manufacturer: Murata Electronics; Manufacturer Part Number: LQW15AN40NJ00D; Self-Resonant Frequency: 3GHz; Q Factor: 25@250MHz; Package Size: 0402; JLCPCB Basic Part: No; JLCPCB Part Number: C237584; Supplier 1: LCSC; Category: Inductors; Supplier Part Number 1: C237584; Tolerance: ±5%; Rated Current: 250mA; DC Resistance: 700mΩ; RoHS: Yes; ComponentLink1Description: Datasheet; ComponentLink1URL: https://wmsc.lcsc.com/wmsc/upload/file/pdf/v2/lcsc/2304140030_Murata-Electronics-LQW15AN40NJ00D_C237584.pdf; ComponentLink2Description: JLCPCB Part URL; ComponentLink2URL: https://jlcpcb.com/partdetail/C237584; ComponentLink3Description: LCSC Part URL; ComponentLink3URL: https://lcsc.com/product-detail/Inductors-SMD_Murata-Electronics-Murata-Electronics-LQW15AN40NJ00D_C237584.html
footprint IND-0402 (0402 (1005M) Inductor)
pins: 1, 2

## LQW15AN43NG00D
designator L?  Inductance: 43nH
Inductor, 43nH, ±2%, 700mΩ, 250mA, SMD 0402; Manufacturer: Murata Electronics; Manufacturer Part Number: LQW15AN43NG00D; Self-Resonant Frequency: 3GHz; Q Factor: 25@250MHz; Package Size: 0402; JLCPCB Basic Part: No; JLCPCB Part Number: C167478; Supplier 1: LCSC; Category: Inductors; Supplier Part Number 1: C167478; Tolerance: ±2%; Rated Current: 250mA; DC Resistance: 700mΩ; RoHS: Yes; ComponentLink1Description: Datasheet; ComponentLink1URL: https://wmsc.lcsc.com/wmsc/upload/file/pdf/v2/lcsc/2304140030_Murata-Electronics-LQW15AN43NG00D_C167478.pdf; ComponentLink2Description: JLCPCB Part URL; ComponentLink2URL: https://jlcpcb.com/partdetail/C167478; ComponentLink3Description: LCSC Part URL; ComponentLink3URL: https://lcsc.com/product-detail/Inductors-SMD_Murata-Electronics-Murata-Electronics-LQW15AN43NG00D_C167478.html
footprint IND-0402 (0402 (1005M) Inductor)
pins: 1, 2

## LQW15AN43NJ00D
designator L?  Inductance: 43nH
Inductor, 43nH, ±5%, 700mΩ, 250mA, SMD 0402; Manufacturer: Murata Electronics; Manufacturer Part Number: LQW15AN43NJ00D; Self-Resonant Frequency: 3GHz; Q Factor: 25@250MHz; Package Size: 0402; JLCPCB Basic Part: No; JLCPCB Part Number: C167479; Supplier 1: LCSC; Category: Inductors; Supplier Part Number 1: C167479; Tolerance: ±5%; Rated Current: 250mA; DC Resistance: 700mΩ; RoHS: Yes; ComponentLink1Description: Datasheet; ComponentLink1URL: https://wmsc.lcsc.com/wmsc/upload/file/pdf/v2/lcsc/2304140030_Murata-Electronics-LQW15AN43NJ00D_C167479.pdf; ComponentLink2Description: JLCPCB Part URL; ComponentLink2URL: https://jlcpcb.com/partdetail/C167479; ComponentLink3Description: LCSC Part URL; ComponentLink3URL: https://lcsc.com/product-detail/Inductors-SMD_Murata-Electronics-Murata-Electronics-LQW15AN43NJ00D_C167479.html
footprint IND-0402 (0402 (1005M) Inductor)
pins: 1, 2

## LQW15AN43NJ0ZD
designator L?  Inductance: 43nH
Inductor, 43nH, ±5%, 700mΩ, 250mA, SMD 0402; Manufacturer: Murata Electronics; Manufacturer Part Number: LQW15AN43NJ0ZD; Package Size: 0402; JLCPCB Basic Part: No; JLCPCB Part Number: C408159; Supplier 1: LCSC; Category: Inductors; Supplier Part Number 1: C408159; Tolerance: ±5%; Rated Current: 250mA; DC Resistance: 700mΩ; RoHS: Yes; ComponentLink1Description: Datasheet; ComponentLink1URL: https://wmsc.lcsc.com/wmsc/upload/file/pdf/v2/lcsc/2304140030_Murata-Electronics-LQW15AN43NJ0ZD_C408159.pdf; ComponentLink2Description: JLCPCB Part URL; ComponentLink2URL: https://jlcpcb.com/partdetail/C408159; ComponentLink3Description: LCSC Part URL; ComponentLink3URL: https://lcsc.com/product-detail/Inductors-SMD_Murata-Electronics-Murata-Electronics-LQW15AN43NJ0ZD_C408159.html
footprint IND-0402 (0402 (1005M) Inductor)
pins: 1, 2

## LQW15AN47NG00D
designator L?  Inductance: 47nH
Inductor, 47nH, ±2%, 1.08Ω, 210mA, SMD 0402; Manufacturer: Murata Electronics; Manufacturer Part Number: LQW15AN47NG00D; Self-Resonant Frequency: 2.9GHz; Q Factor: 25@200MHz; Package Size: 0402; JLCPCB Basic Part: No; JLCPCB Part Number: C22334; Supplier 1: LCSC; Category: Inductors; Supplier Part Number 1: C22334; Tolerance: ±2%; Rated Current: 210mA; DC Resistance: 1.08Ω; RoHS: Yes; ComponentLink1Description: Datasheet; ComponentLink1URL: https://wmsc.lcsc.com/wmsc/upload/file/pdf/v2/lcsc/1811081610_Murata-Electronics-LQW15AN47NG00D_C22334.pdf; ComponentLink2Description: JLCPCB Part URL; ComponentLink2URL: https://jlcpcb.com/partdetail/C22334; ComponentLink3Description: LCSC Part URL; ComponentLink3URL: https://lcsc.com/product-detail/Inductors-SMD_Murata-Electronics-Murata-Electronics-LQW15AN47NG00D_C22334.html
footprint IND-0402 (0402 (1005M) Inductor)
pins: 1, 2

## LQW15AN47NG80D
designator L?  Inductance: 47nH
Inductor, 47nH, ±2%, 648mΩ, 440mA, SMD 0402; Manufacturer: Murata Electronics; Manufacturer Part Number: LQW15AN47NG80D; Self-Resonant Frequency: 3.2GHz; Q Factor: 25@250MHz; Package Size: 0402; JLCPCB Basic Part: No; JLCPCB Part Number: C237556; Supplier 1: LCSC; Category: Inductors; Supplier Part Number 1: C237556; Tolerance: ±2%; Rated Current: 440mA; DC Resistance: 648mΩ; RoHS: Yes; ComponentLink1Description: Datasheet; ComponentLink1URL: https://wmsc.lcsc.com/wmsc/upload/file/pdf/v2/lcsc/2304140030_Murata-Electronics-LQW15AN47NG80D_C237556.pdf; ComponentLink2Description: JLCPCB Part URL; ComponentLink2URL: https://jlcpcb.com/partdetail/C237556; ComponentLink3Description: LCSC Part URL; ComponentLink3URL: https://lcsc.com/product-detail/Inductors-SMD_Murata-Electronics-Murata-Electronics-LQW15AN47NG80D_C237556.html
footprint IND-0402 (0402 (1005M) Inductor)
pins: 1, 2

## LQW15AN47NJ00D
designator L?  Inductance: 47nH
Inductor, 47nH, ±5%, 1.08Ω, SMD 0402; Manufacturer: Murata Electronics; Manufacturer Part Number: LQW15AN47NJ00D; Self-Resonant Frequency: 2.9GHz; Q Factor: 25@200MHz; Package Size: 0402; JLCPCB Basic Part: No; JLCPCB Part Number: C192855; Supplier 1: LCSC; Category: Inductors; Supplier Part Number 1: C192855; Tolerance: ±5%; DC Resistance: 1.08Ω; RoHS: Yes; ComponentLink1Description: Datasheet; ComponentLink1URL: https://wmsc.lcsc.com/wmsc/upload/file/pdf/v2/lcsc/2304140030_Murata-Electronics-LQW15AN47NJ00D_C192855.pdf; ComponentLink2Description: JLCPCB Part URL; ComponentLink2URL: https://jlcpcb.com/partdetail/C192855; ComponentLink3Description: LCSC Part URL; ComponentLink3URL: https://lcsc.com/product-detail/Inductors-SMD_Murata-Electronics-Murata-Electronics-LQW15AN47NJ00D_C192855.html
footprint IND-0402 (0402 (1005M) Inductor)
pins: 1, 2

## LQW15AN51NJ00D
designator L?  Inductance: 51nH
Inductor, 51nH, ±5%, 1.08Ω, 210mA, SMD 0402; Manufacturer: Murata Electronics; Manufacturer Part Number: LQW15AN51NJ00D; Package Size: 0402; JLCPCB Basic Part: No; JLCPCB Part Number: C269825; Supplier 1: LCSC; Category: Inductors; Supplier Part Number 1: C269825; Tolerance: ±5%; Rated Current: 210mA; DC Resistance: 1.08Ω; RoHS: Yes; ComponentLink1Description: Datasheet; ComponentLink1URL: https://wmsc.lcsc.com/wmsc/upload/file/pdf/v2/lcsc/2308111549_Murata-Electronics-LQW15AN51NJ00D_C269825.pdf; ComponentLink2Description: JLCPCB Part URL; ComponentLink2URL: https://jlcpcb.com/partdetail/C269825; ComponentLink3Description: LCSC Part URL; ComponentLink3URL: https://lcsc.com/product-detail/Power-Inductors_Murata-Electronics-Murata-Electronics-LQW15AN51NJ00D_C269825.html
footprint IND-0402 (0402 (1005M) Inductor)
pins: 1, 2

## LQW15AN51NJ0ZD
designator L?  Inductance: 51nH
Inductor, 51nH, ±5%, 1.08Ω, 210mA, SMD 0402; Manufacturer: Murata Electronics; Manufacturer Part Number: LQW15AN51NJ0ZD; Package Size: 0402; JLCPCB Basic Part: No; JLCPCB Part Number: C408160; Supplier 1: LCSC; Category: Inductors; Supplier Part Number 1: C408160; Tolerance: ±5%; Rated Current: 210mA; DC Resistance: 1.08Ω; RoHS: Yes; ComponentLink1Description: Datasheet; ComponentLink1URL: https://wmsc.lcsc.com/wmsc/upload/file/pdf/v2/lcsc/2304140030_Murata-Electronics-LQW15AN51NJ0ZD_C408160.pdf; ComponentLink2Description: JLCPCB Part URL; ComponentLink2URL: https://jlcpcb.com/partdetail/C408160; ComponentLink3Description: LCSC Part URL; ComponentLink3URL: https://lcsc.com/product-detail/Inductors-SMD_Murata-Electronics-Murata-Electronics-LQW15AN51NJ0ZD_C408160.html
footprint IND-0402 (0402 (1005M) Inductor)
pins: 1, 2

## LQW15AN56NG00D
designator L?  Inductance: 56nH
Inductor, 56nH, ±2%, 1.17Ω, 200mA, SMD 0402; Manufacturer: Murata Electronics; Manufacturer Part Number: LQW15AN56NG00D; Self-Resonant Frequency: 2.8GHz; Q Factor: 25@200MHz; Package Size: 0402; JLCPCB Basic Part: No; JLCPCB Part Number: C167482; Supplier 1: LCSC; Category: Inductors; Supplier Part Number 1: C167482; Tolerance: ±2%; Rated Current: 200mA; DC Resistance: 1.17Ω; RoHS: Yes; ComponentLink1Description: Datasheet; ComponentLink1URL: https://wmsc.lcsc.com/wmsc/upload/file/pdf/v2/lcsc/2304140030_Murata-Electronics-LQW15AN56NG00D_C167482.pdf; ComponentLink2Description: JLCPCB Part URL; ComponentLink2URL: https://jlcpcb.com/partdetail/C167482; ComponentLink3Description: LCSC Part URL; ComponentLink3URL: https://lcsc.com/product-detail/Inductors-SMD_Murata-Electronics-Murata-Electronics-LQW15AN56NG00D_C167482.html
footprint IND-0402 (0402 (1005M) Inductor)
pins: 1, 2
